# Altium schematic symbol library jlcpcb_2025_04_capacitors_extended_1206.schlib: 2503 symbols (part 13 of 14)
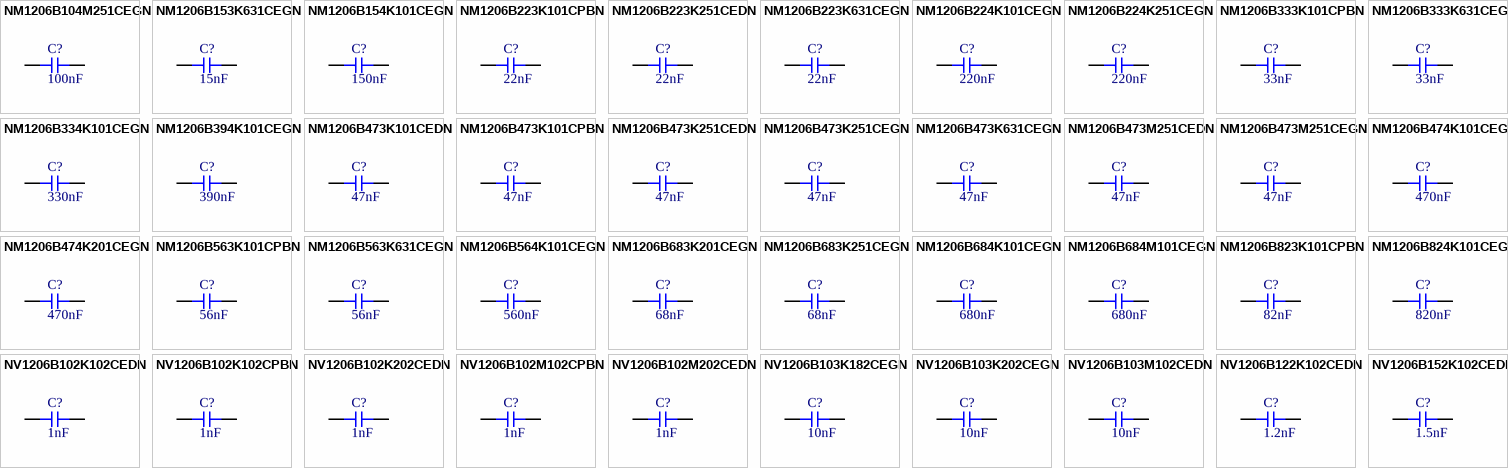
[diagram p74: symbols NM1206B104M251CEGN to NV1206B152K102CEDN]

## NV1206B103K202CEGN
designator C?  Capacitance: 10nF  (hidden comment: *)
Capacitor, Ceramic (MLCC), 10nF, ±10%, 2kV, ±10%, SMD 1206; Manufacturer: HUI JU; Manufacturer Part Number: NV1206B103K202CEGN; Package Size: 1206; JLCPCB Basic Part: No; JLCPCB Part Number: C976252; Supplier 1: LCSC; Category: Capacitors - MLCC; Supplier Part Number 1: C976252; Tolerance: ±10%; Voltage Rating: 2kV; RoHS: Yes; ComponentLink1Description: Datasheet; ComponentLink1URL: https://wmsc.lcsc.com/wmsc/upload/file/pdf/v2/lcsc/2201131430_HUI-JU-NV1206B103K202CEGN_C976252.pdf; ComponentLink2Description: JLCPCB Part URL; ComponentLink2URL: https://jlcpcb.com/partdetail/C976252; ComponentLink3Description: LCSC Part URL; ComponentLink3URL: https://lcsc.com/product-detail/Multilayer-Ceramic-Capacitors-MLCC---SMD-SMT_HUI-JU-HUI-JU-NV1206B103K202CEGN_C976252.html
footprint CAP-1206 (1206 (3216M) Capacitor)
pins: 1, 2

## NV1206B103M102CEDN
designator C?  Capacitance: 10nF  (hidden comment: *)
Capacitor, Ceramic (MLCC), 10nF, ±20%, 1kV, X7R, ±20%, SMD 1206; Manufacturer: HUI JU; Manufacturer Part Number: NV1206B103M102CEDN; Package Size: 1206; JLCPCB Basic Part: No; JLCPCB Part Number: C840120; Supplier 1: LCSC; Category: Capacitors - MLCC; Supplier Part Number 1: C840120; Tolerance: ±20%; Voltage Rating: 1kV; Temperature Coefficient: X7R; RoHS: Yes; ComponentLink1Description: Datasheet; ComponentLink1URL: https://wmsc.lcsc.com/wmsc/upload/file/pdf/v2/lcsc/2304140030_HUI-JU-NV1206B103M102CEDN_C840120.pdf; ComponentLink2Description: JLCPCB Part URL; ComponentLink2URL: https://jlcpcb.com/partdetail/C840120; ComponentLink3Description: LCSC Part URL; ComponentLink3URL: https://lcsc.com/product-detail/Multilayer-Ceramic-Capacitors-MLCC---SMD-SMT_HUI-JU-HUI-JU-NV1206B103M102CEDN_C840120.html
footprint CAP-1206 (1206 (3216M) Capacitor)
pins: 1, 2

## NV1206B122K102CEDN
designator C?  Capacitance: 1.2nF  (hidden comment: *)
Capacitor, Ceramic (MLCC), 1.2nF, ±10%, 1kV, ±10%, SMD 1206; Manufacturer: HUI JU; Manufacturer Part Number: NV1206B122K102CEDN; Package Size: 1206; JLCPCB Basic Part: No; JLCPCB Part Number: C2835170; Supplier 1: LCSC; Category: Capacitors - MLCC; Supplier Part Number 1: C2835170; Tolerance: ±10%; Voltage Rating: 1kV; RoHS: Yes; ComponentLink1Description: Datasheet; ComponentLink1URL: https://wmsc.lcsc.com/wmsc/upload/file/pdf/v2/lcsc/2304140030_HUI-JU-NV1206B122K102CEDN_C2835170.pdf; ComponentLink2Description: JLCPCB Part URL; ComponentLink2URL: https://jlcpcb.com/partdetail/C2835170; ComponentLink3Description: LCSC Part URL; ComponentLink3URL: https://lcsc.com/product-detail/Multilayer-Ceramic-Capacitors-MLCC---SMD-SMT_HUI-JU-HUI-JU-NV1206B122K102CEDN_C2835170.html
footprint CAP-1206 (1206 (3216M) Capacitor)
pins: 1, 2

## NV1206B152K102CEDN
designator C?  Capacitance: 1.5nF  (hidden comment: *)
Capacitor, Ceramic (MLCC), 1.5nF, ±10%, 1kV, X7R, ±10%, SMD 1206; Manufacturer: HUI JU; Manufacturer Part Number: NV1206B152K102CEDN; Package Size: 1206; JLCPCB Basic Part: No; JLCPCB Part Number: C710471; Supplier 1: LCSC; Category: Capacitors - MLCC; Supplier Part Number 1: C710471; Tolerance: ±10%; Voltage Rating: 1kV; Temperature Coefficient: X7R; RoHS: Yes; ComponentLink1Description: Datasheet; ComponentLink1URL: https://wmsc.lcsc.com/wmsc/upload/file/pdf/v2/lcsc/2304140030_HUI-JU-NV1206B152K102CEDN_C710471.pdf; ComponentLink2Description: JLCPCB Part URL; ComponentLink2URL: https://jlcpcb.com/partdetail/C710471; ComponentLink3Description: LCSC Part URL; ComponentLink3URL: https://lcsc.com/product-detail/Multilayer-Ceramic-Capacitors-MLCC---SMD-SMT_HUI-JU-HUI-JU-NV1206B152K102CEDN_C710471.html
footprint CAP-1206 (1206 (3216M) Capacitor)
pins: 1, 2

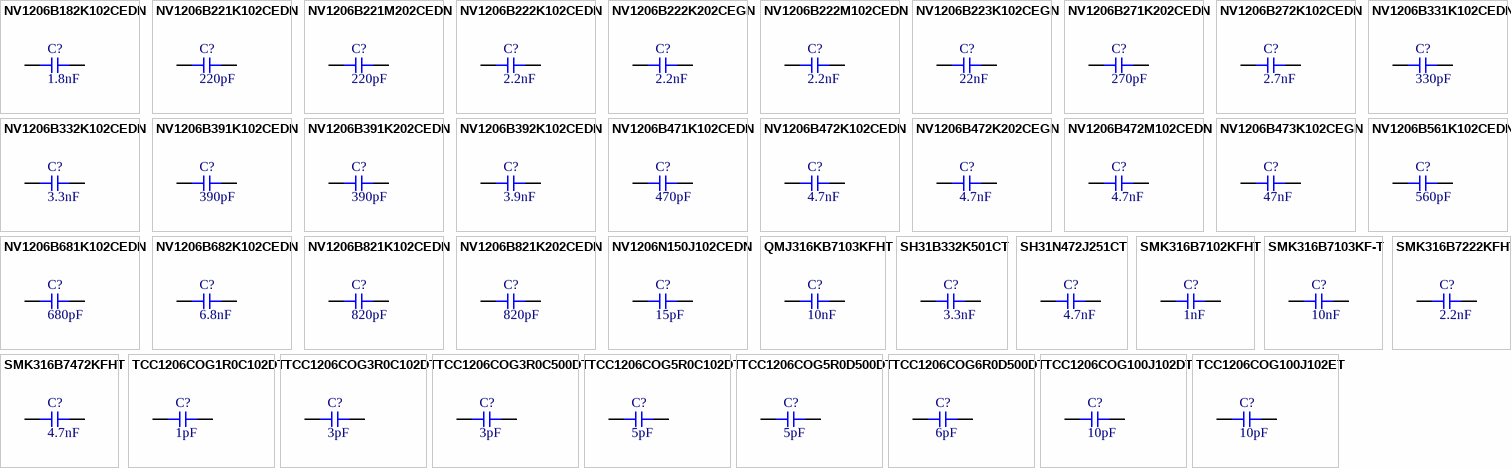
[diagram p55: symbols NV1206B182K102CEDN to TCC1206COG100J102ET]

## NV1206B182K102CEDN
designator C?  Capacitance: 1.8nF  (hidden comment: *)
Capacitor, Ceramic (MLCC), 1.8nF, 1kV, SMD 1206; Manufacturer: HUI JU; Manufacturer Part Number: NV1206B182K102CEDN; Package Size: 1206; JLCPCB Basic Part: No; JLCPCB Part Number: C2760344; Supplier 1: LCSC; Category: Capacitors - MLCC; Supplier Part Number 1: C2760344; Voltage Rating: 1kV; RoHS: Yes; ComponentLink1Description: Datasheet; ComponentLink1URL: https://wmsc.lcsc.com/wmsc/upload/file/pdf/v2/lcsc/2304140030_HUI-JU-NV1206B182K102CEDN_C2760344.pdf; ComponentLink2Description: JLCPCB Part URL; ComponentLink2URL: https://jlcpcb.com/partdetail/C2760344; ComponentLink3Description: LCSC Part URL; ComponentLink3URL: https://lcsc.com/product-detail/Multilayer-Ceramic-Capacitors-MLCC---SMD-SMT_HUI-JU-HUI-JU-NV1206B182K102CEDN_C2760344.html
footprint CAP-1206 (1206 (3216M) Capacitor)
pins: 1, 2

## NV1206B221K102CEDN
designator C?  Capacitance: 220pF  (hidden comment: *)
Capacitor, Ceramic (MLCC), 220pF, ±10%, 1kV, X7R, ±10%, SMD 1206; Manufacturer: HUI JU; Manufacturer Part Number: NV1206B221K102CEDN; Package Size: 1206; JLCPCB Basic Part: No; JLCPCB Part Number: C710472; Supplier 1: LCSC; Category: Capacitors - MLCC; Supplier Part Number 1: C710472; Tolerance: ±10%; Voltage Rating: 1kV; Temperature Coefficient: X7R; RoHS: Yes; ComponentLink1Description: Datasheet; ComponentLink1URL: https://wmsc.lcsc.com/wmsc/upload/file/pdf/v2/lcsc/2304140030_HUI-JU-NV1206B221K102CEDN_C710472.pdf; ComponentLink2Description: JLCPCB Part URL; ComponentLink2URL: https://jlcpcb.com/partdetail/C710472; ComponentLink3Description: LCSC Part URL; ComponentLink3URL: https://lcsc.com/product-detail/Multilayer-Ceramic-Capacitors-MLCC---SMD-SMT_HUI-JU-HUI-JU-NV1206B221K102CEDN_C710472.html
footprint CAP-1206 (1206 (3216M) Capacitor)
pins: 1, 2

## NV1206B221M202CEDN
designator C?  Capacitance: 220pF  (hidden comment: *)
Capacitor, Ceramic (MLCC), 220pF, 2kV, SMD 1206; Manufacturer: HUI JU; Manufacturer Part Number: NV1206B221M202CEDN; Package Size: 1206; JLCPCB Basic Part: No; JLCPCB Part Number: C2760355; Supplier 1: LCSC; Category: Capacitors - MLCC; Supplier Part Number 1: C2760355; Voltage Rating: 2kV; RoHS: Yes; ComponentLink1Description: Datasheet; ComponentLink1URL: https://wmsc.lcsc.com/wmsc/upload/file/pdf/v2/lcsc/2304140030_HUI-JU-NV1206B221M202CEDN_C2760355.pdf; ComponentLink2Description: JLCPCB Part URL; ComponentLink2URL: https://jlcpcb.com/partdetail/C2760355; ComponentLink3Description: LCSC Part URL; ComponentLink3URL: https://lcsc.com/product-detail/Multilayer-Ceramic-Capacitors-MLCC---SMD-SMT_HUI-JU-HUI-JU-NV1206B221M202CEDN_C2760355.html
footprint CAP-1206 (1206 (3216M) Capacitor)
pins: 1, 2

## NV1206B222K102CEDN
designator C?  Capacitance: 2.2nF  (hidden comment: *)
Capacitor, Ceramic (MLCC), 2.2nF, ±10%, 1kV, X7R, ±10%, SMD 1206; Manufacturer: HUI JU; Manufacturer Part Number: NV1206B222K102CEDN; Package Size: 1206; JLCPCB Basic Part: No; JLCPCB Part Number: C710473; Supplier 1: LCSC; Category: Capacitors - MLCC; Supplier Part Number 1: C710473; Tolerance: ±10%; Voltage Rating: 1kV; Temperature Coefficient: X7R; RoHS: Yes; ComponentLink1Description: Datasheet; ComponentLink1URL: https://wmsc.lcsc.com/wmsc/upload/file/pdf/v2/lcsc/2304140030_HUI-JU-NV1206B222K102CEDN_C710473.pdf; ComponentLink2Description: JLCPCB Part URL; ComponentLink2URL: https://jlcpcb.com/partdetail/C710473; ComponentLink3Description: LCSC Part URL; ComponentLink3URL: https://lcsc.com/product-detail/Multilayer-Ceramic-Capacitors-MLCC---SMD-SMT_HUI-JU-HUI-JU-NV1206B222K102CEDN_C710473.html
footprint CAP-1206 (1206 (3216M) Capacitor)
pins: 1, 2

## NV1206B222K202CEGN
designator C?  Capacitance: 2.2nF  (hidden comment: *)
Capacitor, Ceramic (MLCC), 2.2nF, ±10%, 2kV, X7R, ±10%, SMD 1206; Manufacturer: HUI JU; Manufacturer Part Number: NV1206B222K202CEGN; Package Size: 1206; JLCPCB Basic Part: No; JLCPCB Part Number: C720963; Supplier 1: LCSC; Category: Capacitors - MLCC; Supplier Part Number 1: C720963; Tolerance: ±10%; Voltage Rating: 2kV; Temperature Coefficient: X7R; RoHS: Yes; ComponentLink1Description: Datasheet; ComponentLink1URL: https://wmsc.lcsc.com/wmsc/upload/file/pdf/v2/lcsc/2304140030_HUI-JU-NV1206B222K202CEGN_C720963.pdf; ComponentLink2Description: JLCPCB Part URL; ComponentLink2URL: https://jlcpcb.com/partdetail/C720963; ComponentLink3Description: LCSC Part URL; ComponentLink3URL: https://lcsc.com/product-detail/Multilayer-Ceramic-Capacitors-MLCC---SMD-SMT_HUI-JU-HUI-JU-NV1206B222K202CEGN_C720963.html
footprint CAP-1206 (1206 (3216M) Capacitor)
pins: 1, 2

## NV1206B222M102CEDN
designator C?  Capacitance: 2.2nF  (hidden comment: *)
Capacitor, Ceramic (MLCC), 2.2nF, ±20%, 1kV, ±20%, SMD 1206; Manufacturer: HUI JU; Manufacturer Part Number: NV1206B222M102CEDN; Package Size: 1206; JLCPCB Basic Part: No; JLCPCB Part Number: C841556; Supplier 1: LCSC; Category: Capacitors - MLCC; Supplier Part Number 1: C841556; Tolerance: ±20%; Voltage Rating: 1kV; RoHS: Yes; ComponentLink1Description: Datasheet; ComponentLink1URL: https://wmsc.lcsc.com/wmsc/upload/file/pdf/v2/lcsc/2304140030_HUI-JU-NV1206B222M102CEDN_C841556.pdf; ComponentLink2Description: JLCPCB Part URL; ComponentLink2URL: https://jlcpcb.com/partdetail/C841556; ComponentLink3Description: LCSC Part URL; ComponentLink3URL: https://lcsc.com/product-detail/Multilayer-Ceramic-Capacitors-MLCC---SMD-SMT_HUI-JU-HUI-JU-NV1206B222M102CEDN_C841556.html
footprint CAP-1206 (1206 (3216M) Capacitor)
pins: 1, 2

## NV1206B223K102CEGN
designator C?  Capacitance: 22nF  (hidden comment: *)
Capacitor, Ceramic (MLCC), 22nF, ±10%, 1kV, ±10%, SMD 1206; Manufacturer: HUI JU; Manufacturer Part Number: NV1206B223K102CEGN; Package Size: 1206; JLCPCB Basic Part: No; JLCPCB Part Number: C780704; Supplier 1: LCSC; Category: Capacitors - MLCC; Supplier Part Number 1: C780704; Tolerance: ±10%; Voltage Rating: 1kV; RoHS: Yes; ComponentLink1Description: Datasheet; ComponentLink1URL: https://wmsc.lcsc.com/wmsc/upload/file/pdf/v2/lcsc/2304140030_HUI-JU-NV1206B223K102CEGN_C780704.pdf; ComponentLink2Description: JLCPCB Part URL; ComponentLink2URL: https://jlcpcb.com/partdetail/C780704; ComponentLink3Description: LCSC Part URL; ComponentLink3URL: https://lcsc.com/product-detail/Multilayer-Ceramic-Capacitors-MLCC---SMD-SMT_HUI-JU-HUI-JU-NV1206B223K102CEGN_C780704.html
footprint CAP-1206 (1206 (3216M) Capacitor)
pins: 1, 2

## NV1206B271K202CEDN
designator C?  Capacitance: 270pF  (hidden comment: *)
Capacitor, Ceramic (MLCC), 270pF, ±10%, 2kV, ±10%, SMD 1206; Manufacturer: HUI JU; Manufacturer Part Number: NV1206B271K202CEDN; Package Size: 1206; JLCPCB Basic Part: No; JLCPCB Part Number: C841557; Supplier 1: LCSC; Category: Capacitors - MLCC; Supplier Part Number 1: C841557; Tolerance: ±10%; Voltage Rating: 2kV; RoHS: Yes; ComponentLink1Description: Datasheet; ComponentLink1URL: https://wmsc.lcsc.com/wmsc/upload/file/pdf/v2/lcsc/2304140030_HUI-JU-NV1206B271K202CEDN_C841557.pdf; ComponentLink2Description: JLCPCB Part URL; ComponentLink2URL: https://jlcpcb.com/partdetail/C841557; ComponentLink3Description: LCSC Part URL; ComponentLink3URL: https://lcsc.com/product-detail/Multilayer-Ceramic-Capacitors-MLCC---SMD-SMT_HUI-JU-HUI-JU-NV1206B271K202CEDN_C841557.html
footprint CAP-1206 (1206 (3216M) Capacitor)
pins: 1, 2

## NV1206B272K102CEDN
designator C?  Capacitance: 2.7nF  (hidden comment: *)
Capacitor, Ceramic (MLCC), 2.7nF, ±10%, 1kV, ±10%, SMD 1206; Manufacturer: HUI JU; Manufacturer Part Number: NV1206B272K102CEDN; Package Size: 1206; JLCPCB Basic Part: No; JLCPCB Part Number: C841558; Supplier 1: LCSC; Category: Capacitors - MLCC; Supplier Part Number 1: C841558; Tolerance: ±10%; Voltage Rating: 1kV; RoHS: Yes; ComponentLink1Description: Datasheet; ComponentLink1URL: https://wmsc.lcsc.com/wmsc/upload/file/pdf/v2/lcsc/2304140030_HUI-JU-NV1206B272K102CEDN_C841558.pdf; ComponentLink2Description: JLCPCB Part URL; ComponentLink2URL: https://jlcpcb.com/partdetail/C841558; ComponentLink3Description: LCSC Part URL; ComponentLink3URL: https://lcsc.com/product-detail/Multilayer-Ceramic-Capacitors-MLCC---SMD-SMT_HUI-JU-HUI-JU-NV1206B272K102CEDN_C841558.html
footprint CAP-1206 (1206 (3216M) Capacitor)
pins: 1, 2

## NV1206B331K102CEDN
designator C?  Capacitance: 330pF  (hidden comment: *)
Capacitor, Ceramic (MLCC), 330pF, ±10%, 1kV, X7R, ±10%, SMD 1206; Manufacturer: HUI JU; Manufacturer Part Number: NV1206B331K102CEDN; Package Size: 1206; JLCPCB Basic Part: No; JLCPCB Part Number: C725800; Supplier 1: LCSC; Category: Capacitors - MLCC; Supplier Part Number 1: C725800; Tolerance: ±10%; Voltage Rating: 1kV; Temperature Coefficient: X7R; RoHS: Yes; ComponentLink1Description: Datasheet; ComponentLink1URL: https://wmsc.lcsc.com/wmsc/upload/file/pdf/v2/lcsc/2304140030_HUI-JU-NV1206B331K102CEDN_C725800.pdf; ComponentLink2Description: JLCPCB Part URL; ComponentLink2URL: https://jlcpcb.com/partdetail/C725800; ComponentLink3Description: LCSC Part URL; ComponentLink3URL: https://lcsc.com/product-detail/Multilayer-Ceramic-Capacitors-MLCC---SMD-SMT_HUI-JU-HUI-JU-NV1206B331K102CEDN_C725800.html
footprint CAP-1206 (1206 (3216M) Capacitor)
pins: 1, 2

## NV1206B332K102CEDN
designator C?  Capacitance: 3.3nF  (hidden comment: *)
Capacitor, Ceramic (MLCC), 3.3nF, ±10%, 1kV, X7R, ±10%, SMD 1206; Manufacturer: HUI JU; Manufacturer Part Number: NV1206B332K102CEDN; Package Size: 1206; JLCPCB Basic Part: No; JLCPCB Part Number: C710476; Supplier 1: LCSC; Category: Capacitors - MLCC; Supplier Part Number 1: C710476; Tolerance: ±10%; Voltage Rating: 1kV; Temperature Coefficient: X7R; RoHS: Yes; ComponentLink1Description: Datasheet; ComponentLink1URL: https://wmsc.lcsc.com/wmsc/upload/file/pdf/v2/lcsc/2304140030_HUI-JU-NV1206B332K102CEDN_C710476.pdf; ComponentLink2Description: JLCPCB Part URL; ComponentLink2URL: https://jlcpcb.com/partdetail/C710476; ComponentLink3Description: LCSC Part URL; ComponentLink3URL: https://lcsc.com/product-detail/Multilayer-Ceramic-Capacitors-MLCC---SMD-SMT_HUI-JU-HUI-JU-NV1206B332K102CEDN_C710476.html
footprint CAP-1206 (1206 (3216M) Capacitor)
pins: 1, 2

## NV1206B391K102CEDN
designator C?  Capacitance: 390pF  (hidden comment: *)
Capacitor, Ceramic (MLCC), 390pF, ±10%, 1kV, ±10%, SMD 1206; Manufacturer: HUI JU; Manufacturer Part Number: NV1206B391K102CEDN; Package Size: 1206; JLCPCB Basic Part: No; JLCPCB Part Number: C2760364; Supplier 1: LCSC; Category: Capacitors - MLCC; Supplier Part Number 1: C2760364; Tolerance: ±10%; Voltage Rating: 1kV; RoHS: Yes; ComponentLink1Description: Datasheet; ComponentLink1URL: https://wmsc.lcsc.com/wmsc/upload/file/pdf/v2/lcsc/2103161035_HUI-JU-NV1206B391K102CEDN_C2760364.pdf; ComponentLink2Description: JLCPCB Part URL; ComponentLink2URL: https://jlcpcb.com/partdetail/C2760364; ComponentLink3Description: LCSC Part URL; ComponentLink3URL: https://lcsc.com/product-detail/Multilayer-Ceramic-Capacitors-MLCC---SMD-SMT_HUI-JU-HUI-JU-NV1206B391K102CEDN_C2760364.html
footprint CAP-1206 (1206 (3216M) Capacitor)
pins: 1, 2

## NV1206B391K202CEDN
designator C?  Capacitance: 390pF  (hidden comment: *)
Capacitor, Ceramic (MLCC), 390pF, ±10%, 2kV, X7R, ±10%, SMD 1206; Manufacturer: HUI JU; Manufacturer Part Number: NV1206B391K202CEDN; Package Size: 1206; JLCPCB Basic Part: No; JLCPCB Part Number: C840124; Supplier 1: LCSC; Category: Capacitors - MLCC; Supplier Part Number 1: C840124; Tolerance: ±10%; Voltage Rating: 2kV; Temperature Coefficient: X7R; RoHS: Yes; ComponentLink1Description: Datasheet; ComponentLink1URL: https://wmsc.lcsc.com/wmsc/upload/file/pdf/v2/lcsc/2304140030_HUI-JU-NV1206B391K202CEDN_C840124.pdf; ComponentLink2Description: JLCPCB Part URL; ComponentLink2URL: https://jlcpcb.com/partdetail/C840124; ComponentLink3Description: LCSC Part URL; ComponentLink3URL: https://lcsc.com/product-detail/Multilayer-Ceramic-Capacitors-MLCC---SMD-SMT_HUI-JU-HUI-JU-NV1206B391K202CEDN_C840124.html
footprint CAP-1206 (1206 (3216M) Capacitor)
pins: 1, 2

## NV1206B392K102CEDN
designator C?  Capacitance: 3.9nF  (hidden comment: *)
Capacitor, Ceramic (MLCC), 3.9nF, ±10%, 1kV, ±10%, SMD 1206; Manufacturer: HUI JU; Manufacturer Part Number: NV1206B392K102CEDN; Package Size: 1206; JLCPCB Basic Part: No; JLCPCB Part Number: C841562; Supplier 1: LCSC; Category: Capacitors - MLCC; Supplier Part Number 1: C841562; Tolerance: ±10%; Voltage Rating: 1kV; RoHS: Yes; ComponentLink1Description: Datasheet; ComponentLink1URL: https://wmsc.lcsc.com/wmsc/upload/file/pdf/v2/lcsc/2304140030_HUI-JU-NV1206B392K102CEDN_C841562.pdf; ComponentLink2Description: JLCPCB Part URL; ComponentLink2URL: https://jlcpcb.com/partdetail/C841562; ComponentLink3Description: LCSC Part URL; ComponentLink3URL: https://lcsc.com/product-detail/Multilayer-Ceramic-Capacitors-MLCC---SMD-SMT_HUI-JU-HUI-JU-NV1206B392K102CEDN_C841562.html
footprint CAP-1206 (1206 (3216M) Capacitor)
pins: 1, 2

## NV1206B471K102CEDN
designator C?  Capacitance: 470pF  (hidden comment: *)
Capacitor, Ceramic (MLCC), 470pF, ±10%, 1kV, X7R, ±10%, SMD 1206; Manufacturer: HUI JU; Manufacturer Part Number: NV1206B471K102CEDN; Package Size: 1206; JLCPCB Basic Part: No; JLCPCB Part Number: C717018; Supplier 1: LCSC; Category: Capacitors - MLCC; Supplier Part Number 1: C717018; Tolerance: ±10%; Voltage Rating: 1kV; Temperature Coefficient: X7R; RoHS: Yes; ComponentLink1Description: Datasheet; ComponentLink1URL: https://wmsc.lcsc.com/wmsc/upload/file/pdf/v2/lcsc/2304140030_HUI-JU-NV1206B471K102CEDN_C717018.pdf; ComponentLink2Description: JLCPCB Part URL; ComponentLink2URL: https://jlcpcb.com/partdetail/C717018; ComponentLink3Description: LCSC Part URL; ComponentLink3URL: https://lcsc.com/product-detail/Multilayer-Ceramic-Capacitors-MLCC---SMD-SMT_HUI-JU-HUI-JU-NV1206B471K102CEDN_C717018.html
footprint CAP-1206 (1206 (3216M) Capacitor)
pins: 1, 2

## NV1206B472K102CEDN
designator C?  Capacitance: 4.7nF  (hidden comment: *)
Capacitor, Ceramic (MLCC), 4.7nF, ±10%, 1kV, X7R, ±10%, SMD 1206; Manufacturer: HUI JU; Manufacturer Part Number: NV1206B472K102CEDN; Package Size: 1206; JLCPCB Basic Part: No; JLCPCB Part Number: C717016; Supplier 1: LCSC; Category: Capacitors - MLCC; Supplier Part Number 1: C717016; Tolerance: ±10%; Voltage Rating: 1kV; Temperature Coefficient: X7R; RoHS: Yes; ComponentLink1Description: Datasheet; ComponentLink1URL: https://wmsc.lcsc.com/wmsc/upload/file/pdf/v2/lcsc/2304140030_HUI-JU-NV1206B472K102CEDN_C717016.pdf; ComponentLink2Description: JLCPCB Part URL; ComponentLink2URL: https://jlcpcb.com/partdetail/C717016; ComponentLink3Description: LCSC Part URL; ComponentLink3URL: https://lcsc.com/product-detail/Multilayer-Ceramic-Capacitors-MLCC---SMD-SMT_HUI-JU-HUI-JU-NV1206B472K102CEDN_C717016.html
footprint CAP-1206 (1206 (3216M) Capacitor)
pins: 1, 2

## NV1206B472K202CEGN
designator C?  Capacitance: 4.7nF  (hidden comment: *)
Capacitor, Ceramic (MLCC), 4.7nF, ±10%, 2kV, X7R, ±10%, SMD 1206; Manufacturer: HUI JU; Manufacturer Part Number: NV1206B472K202CEGN; Package Size: 1206; JLCPCB Basic Part: No; JLCPCB Part Number: C784438; Supplier 1: LCSC; Category: Capacitors - MLCC; Supplier Part Number 1: C784438; Tolerance: ±10%; Voltage Rating: 2kV; Temperature Coefficient: X7R; RoHS: Yes; ComponentLink1Description: Datasheet; ComponentLink1URL: https://wmsc.lcsc.com/wmsc/upload/file/pdf/v2/lcsc/2304140030_HUI-JU-NV1206B472K202CEGN_C784438.pdf; ComponentLink2Description: JLCPCB Part URL; ComponentLink2URL: https://jlcpcb.com/partdetail/C784438; ComponentLink3Description: LCSC Part URL; ComponentLink3URL: https://lcsc.com/product-detail/Multilayer-Ceramic-Capacitors-MLCC---SMD-SMT_HUI-JU-HUI-JU-NV1206B472K202CEGN_C784438.html
footprint CAP-1206 (1206 (3216M) Capacitor)
pins: 1, 2

## NV1206B472M102CEDN
designator C?  Capacitance: 4.7nF  (hidden comment: *)
Capacitor, Ceramic (MLCC), 4.7nF, ±20%, 1kV, X7R, ±20%, SMD 1206; Manufacturer: HUI JU; Manufacturer Part Number: NV1206B472M102CEDN; Package Size: 1206; JLCPCB Basic Part: No; JLCPCB Part Number: C840126; Supplier 1: LCSC; Category: Capacitors - MLCC; Supplier Part Number 1: C840126; Tolerance: ±20%; Voltage Rating: 1kV; Temperature Coefficient: X7R; RoHS: Yes; ComponentLink1Description: Datasheet; ComponentLink1URL: https://wmsc.lcsc.com/wmsc/upload/file/pdf/v2/lcsc/2304140030_HUI-JU-NV1206B472M102CEDN_C840126.pdf; ComponentLink2Description: JLCPCB Part URL; ComponentLink2URL: https://jlcpcb.com/partdetail/C840126; ComponentLink3Description: LCSC Part URL; ComponentLink3URL: https://lcsc.com/product-detail/Multilayer-Ceramic-Capacitors-MLCC---SMD-SMT_HUI-JU-HUI-JU-NV1206B472M102CEDN_C840126.html
footprint CAP-1206 (1206 (3216M) Capacitor)
pins: 1, 2

## NV1206B473K102CEGN
designator C?  Capacitance: 47nF  (hidden comment: *)
Capacitor, Ceramic (MLCC), 47nF, ±10%, 1kV, X7R, ±10%, SMD 1206; Manufacturer: HUI JU; Manufacturer Part Number: NV1206B473K102CEGN; Package Size: 1206; JLCPCB Basic Part: No; JLCPCB Part Number: C840127; Supplier 1: LCSC; Category: Capacitors - MLCC; Supplier Part Number 1: C840127; Tolerance: ±10%; Voltage Rating: 1kV; Temperature Coefficient: X7R; RoHS: Yes; ComponentLink1Description: Datasheet; ComponentLink1URL: https://wmsc.lcsc.com/wmsc/upload/file/pdf/v2/lcsc/2304140030_HUI-JU-NV1206B473K102CEGN_C840127.pdf; ComponentLink2Description: JLCPCB Part URL; ComponentLink2URL: https://jlcpcb.com/partdetail/C840127; ComponentLink3Description: LCSC Part URL; ComponentLink3URL: https://lcsc.com/product-detail/Multilayer-Ceramic-Capacitors-MLCC---SMD-SMT_HUI-JU-HUI-JU-NV1206B473K102CEGN_C840127.html
footprint CAP-1206 (1206 (3216M) Capacitor)
pins: 1, 2

## NV1206B561K102CEDN
designator C?  Capacitance: 560pF  (hidden comment: *)
Capacitor, Ceramic (MLCC), 560pF, ±10%, 1kV, X7R, ±10%, SMD 1206; Manufacturer: HUI JU; Manufacturer Part Number: NV1206B561K102CEDN; Package Size: 1206; JLCPCB Basic Part: No; JLCPCB Part Number: C784439; Supplier 1: LCSC; Category: Capacitors - MLCC; Supplier Part Number 1: C784439; Tolerance: ±10%; Voltage Rating: 1kV; Temperature Coefficient: X7R; RoHS: Yes; ComponentLink1Description: Datasheet; ComponentLink1URL: https://wmsc.lcsc.com/wmsc/upload/file/pdf/v2/lcsc/2304140030_HUI-JU-NV1206B561K102CEDN_C784439.pdf; ComponentLink2Description: JLCPCB Part URL; ComponentLink2URL: https://jlcpcb.com/partdetail/C784439; ComponentLink3Description: LCSC Part URL; ComponentLink3URL: https://lcsc.com/product-detail/Multilayer-Ceramic-Capacitors-MLCC---SMD-SMT_HUI-JU-HUI-JU-NV1206B561K102CEDN_C784439.html
footprint CAP-1206 (1206 (3216M) Capacitor)
pins: 1, 2

## NV1206B681K102CEDN
designator C?  Capacitance: 680pF  (hidden comment: *)
Capacitor, Ceramic (MLCC), 680pF, ±10%, 1kV, X7R, ±10%, SMD 1206; Manufacturer: HUI JU; Manufacturer Part Number: NV1206B681K102CEDN; Package Size: 1206; JLCPCB Basic Part: No; JLCPCB Part Number: C784440; Supplier 1: LCSC; Category: Capacitors - MLCC; Supplier Part Number 1: C784440; Tolerance: ±10%; Voltage Rating: 1kV; Temperature Coefficient: X7R; RoHS: Yes; ComponentLink1Description: Datasheet; ComponentLink1URL: https://wmsc.lcsc.com/wmsc/upload/file/pdf/v2/lcsc/2304140030_HUI-JU-NV1206B681K102CEDN_C784440.pdf; ComponentLink2Description: JLCPCB Part URL; ComponentLink2URL: https://jlcpcb.com/partdetail/C784440; ComponentLink3Description: LCSC Part URL; ComponentLink3URL: https://lcsc.com/product-detail/Multilayer-Ceramic-Capacitors-MLCC---SMD-SMT_HUI-JU-HUI-JU-NV1206B681K102CEDN_C784440.html
footprint CAP-1206 (1206 (3216M) Capacitor)
pins: 1, 2

## NV1206B682K102CEDN
designator C?  Capacitance: 6.8nF  (hidden comment: *)
Capacitor, Ceramic (MLCC), 6.8nF, ±10%, 1kV, ±10%, SMD 1206; Manufacturer: HUI JU; Manufacturer Part Number: NV1206B682K102CEDN; Package Size: 1206; JLCPCB Basic Part: No; JLCPCB Part Number: C841565; Supplier 1: LCSC; Category: Capacitors - MLCC; Supplier Part Number 1: C841565; Tolerance: ±10%; Voltage Rating: 1kV; RoHS: Yes; ComponentLink1Description: Datasheet; ComponentLink1URL: https://wmsc.lcsc.com/wmsc/upload/file/pdf/v2/lcsc/2304140030_HUI-JU-NV1206B682K102CEDN_C841565.pdf; ComponentLink2Description: JLCPCB Part URL; ComponentLink2URL: https://jlcpcb.com/partdetail/C841565; ComponentLink3Description: LCSC Part URL; ComponentLink3URL: https://lcsc.com/product-detail/Multilayer-Ceramic-Capacitors-MLCC---SMD-SMT_HUI-JU-HUI-JU-NV1206B682K102CEDN_C841565.html
footprint CAP-1206 (1206 (3216M) Capacitor)
pins: 1, 2

## NV1206B821K102CEDN
designator C?  Capacitance: 820pF  (hidden comment: *)
Capacitor, Ceramic (MLCC), 820pF, ±10%, 1kV, ±10%, SMD 1206; Manufacturer: HUI JU; Manufacturer Part Number: NV1206B821K102CEDN; Package Size: 1206; JLCPCB Basic Part: No; JLCPCB Part Number: C841567; Supplier 1: LCSC; Category: Capacitors - MLCC; Supplier Part Number 1: C841567; Tolerance: ±10%; Voltage Rating: 1kV; RoHS: Yes; ComponentLink1Description: Datasheet; ComponentLink1URL: https://wmsc.lcsc.com/wmsc/upload/file/pdf/v2/lcsc/2304140030_HUI-JU-NV1206B821K102CEDN_C841567.pdf; ComponentLink2Description: JLCPCB Part URL; ComponentLink2URL: https://jlcpcb.com/partdetail/C841567; ComponentLink3Description: LCSC Part URL; ComponentLink3URL: https://lcsc.com/product-detail/Multilayer-Ceramic-Capacitors-MLCC---SMD-SMT_HUI-JU-HUI-JU-NV1206B821K102CEDN_C841567.html
footprint CAP-1206 (1206 (3216M) Capacitor)
pins: 1, 2

## NV1206B821K202CEDN
designator C?  Capacitance: 820pF  (hidden comment: *)
Capacitor, Ceramic (MLCC), 820pF, ±10%, 2kV, ±10%, SMD 1206; Manufacturer: HUI JU; Manufacturer Part Number: NV1206B821K202CEDN; Package Size: 1206; JLCPCB Basic Part: No; JLCPCB Part Number: C841568; Supplier 1: LCSC; Category: Capacitors - MLCC; Supplier Part Number 1: C841568; Tolerance: ±10%; Voltage Rating: 2kV; RoHS: Yes; ComponentLink1Description: Datasheet; ComponentLink1URL: https://wmsc.lcsc.com/wmsc/upload/file/pdf/v2/lcsc/2304140030_HUI-JU-NV1206B821K202CEDN_C841568.pdf; ComponentLink2Description: JLCPCB Part URL; ComponentLink2URL: https://jlcpcb.com/partdetail/C841568; ComponentLink3Description: LCSC Part URL; ComponentLink3URL: https://lcsc.com/product-detail/Multilayer-Ceramic-Capacitors-MLCC---SMD-SMT_HUI-JU-HUI-JU-NV1206B821K202CEDN_C841568.html
footprint CAP-1206 (1206 (3216M) Capacitor)
pins: 1, 2

## NV1206N150J102CEDN
designator C?  Capacitance: 15pF  (hidden comment: *)
Capacitor, Ceramic (MLCC), 15pF, ±5%, 1kV, C0G, ±5%, SMD 1206; Manufacturer: HUI JU; Manufacturer Part Number: NV1206N150J102CEDN; Package Size: 1206; JLCPCB Basic Part: No; JLCPCB Part Number: C2961032; Supplier 1: LCSC; Category: Capacitors - MLCC; Supplier Part Number 1: C2961032; Tolerance: ±5%; Voltage Rating: 1kV; Temperature Coefficient: C0G; RoHS: Yes; ComponentLink1Description: Datasheet; ComponentLink1URL: https://wmsc.lcsc.com/wmsc/upload/file/pdf/v2/lcsc/2201141700_HUI-JU-NV1206N150J102CEDN_C2961032.pdf; ComponentLink2Description: JLCPCB Part URL; ComponentLink2URL: https://jlcpcb.com/partdetail/C2961032; ComponentLink3Description: LCSC Part URL; ComponentLink3URL: https://lcsc.com/product-detail/Multilayer-Ceramic-Capacitors-MLCC---SMD-SMT_HUI-JU-HUI-JU-NV1206N150J102CEDN_C2961032.html
footprint CAP-1206 (1206 (3216M) Capacitor)
pins: 1, 2

## QMJ316KB7103KFHT
designator C?  Capacitance: 10nF  (hidden comment: *)
Capacitor, Ceramic (MLCC), 10nF, ±10%, 250V, X7R, ±10%, SMD 1206; Manufacturer: Taiyo Yuden; Manufacturer Part Number: QMJ316KB7103KFHT; Package Size: 1206; JLCPCB Basic Part: No; JLCPCB Part Number: C2175940; Supplier 1: LCSC; Category: Capacitors - MLCC; Supplier Part Number 1: C2175940; Tolerance: ±10%; Voltage Rating: 250V; Temperature Coefficient: X7R; RoHS: Yes; ComponentLink1Description: Datasheet; ComponentLink1URL: https://wmsc.lcsc.com/wmsc/upload/file/pdf/v2/lcsc/2211282000_Taiyo-Yuden-QMJ316KB7103KFHT_C2175940.pdf; ComponentLink2Description: JLCPCB Part URL; ComponentLink2URL: https://jlcpcb.com/partdetail/C2175940; ComponentLink3Description: LCSC Part URL; ComponentLink3URL: https://lcsc.com/product-detail/Multilayer-Ceramic-Capacitors-MLCC---SMD-SMT_Taiyo-Yuden-Taiyo-Yuden-QMJ316KB7103KFHT_C2175940.html
footprint CAP-1206 (1206 (3216M) Capacitor)
pins: 1, 2

## SH31B332K501CT
designator C?  Capacitance: 3.3nF  (hidden comment: *)
Capacitor, Ceramic (MLCC), 3.3nF, ±10%, 500V, X7R, ±10%, SMD 1206; Manufacturer: Walsin Tech Corp; Manufacturer Part Number: SH31B332K501CT; Package Size: 1206; JLCPCB Basic Part: No; JLCPCB Part Number: C305138; Supplier 1: LCSC; Category: Capacitors - MLCC; Supplier Part Number 1: C305138; Tolerance: ±10%; Voltage Rating: 500V; Temperature Coefficient: X7R; RoHS: Yes; ComponentLink1Description: Datasheet; ComponentLink1URL: https://wmsc.lcsc.com/wmsc/upload/file/pdf/v2/lcsc/1811021514_Walsin-Tech-Corp-SH31B332K501CT_C305138.pdf; ComponentLink2Description: JLCPCB Part URL; ComponentLink2URL: https://jlcpcb.com/partdetail/C305138; ComponentLink3Description: LCSC Part URL; ComponentLink3URL: https://lcsc.com/product-detail/Multilayer-Ceramic-Capacitors-MLCC---SMD-SMT_Walsin-Tech-Corp-Walsin-Tech-Corp-SH31B332K501CT_C305138.html
footprint CAP-1206 (1206 (3216M) Capacitor)
pins: 1, 2

## SH31N472J251CT
designator C?  Capacitance: 4.7nF  (hidden comment: *)
Capacitor, Ceramic (MLCC), 4.7nF, ±5%, 250V, C0G, ±5%, SMD 1206; Manufacturer: Walsin Tech Corp; Manufacturer Part Number: SH31N472J251CT; Package Size: 1206; JLCPCB Basic Part: No; JLCPCB Part Number: C3836286; Supplier 1: LCSC; Category: Capacitors - MLCC; Supplier Part Number 1: C3836286; Tolerance: ±5%; Voltage Rating: 250V; Temperature Coefficient: C0G; RoHS: Yes; ComponentLink1Description: Datasheet; ComponentLink1URL: https://wmsc.lcsc.com/wmsc/upload/file/pdf/v2/lcsc/2401181522_Walsin-Tech-Corp-SH31N472J251CT_C3836286.pdf; ComponentLink2Description: JLCPCB Part URL; ComponentLink2URL: https://jlcpcb.com/partdetail/C3836286; ComponentLink3Description: LCSC Part URL; ComponentLink3URL: https://lcsc.com/product-detail/Multilayer-Ceramic-Capacitors-MLCC---SMD-SMT_Walsin-Tech-Corp-Walsin-Tech-Corp-SH31N472J251CT_C3836286.html
footprint CAP-1206 (1206 (3216M) Capacitor)
pins: 1, 2

## SMK316B7102KFHT
designator C?  Capacitance: 1nF  (hidden comment: *)
Capacitor, Ceramic (MLCC), 1nF, ±10%, 630V, X7R, ±10%, SMD 1206; Manufacturer: Taiyo Yuden; Manufacturer Part Number: SMK316B7102KFHT; Package Size: 1206; JLCPCB Basic Part: No; JLCPCB Part Number: C651029; Supplier 1: LCSC; Category: Capacitors - MLCC; Supplier Part Number 1: C651029; Tolerance: ±10%; Voltage Rating: 630V; Temperature Coefficient: X7R; RoHS: Yes; ComponentLink1Description: Datasheet; ComponentLink1URL: https://wmsc.lcsc.com/wmsc/upload/file/pdf/v2/lcsc/2304140030_Taiyo-Yuden-SMK316B7102KFHT_C651029.pdf; ComponentLink2Description: JLCPCB Part URL; ComponentLink2URL: https://jlcpcb.com/partdetail/C651029; ComponentLink3Description: LCSC Part URL; ComponentLink3URL: https://lcsc.com/product-detail/Multilayer-Ceramic-Capacitors-MLCC---SMD-SMT_Taiyo-Yuden-Taiyo-Yuden-SMK316B7102KFHT_C651029.html
footprint CAP-1206 (1206 (3216M) Capacitor)
pins: 1, 2

## SMK316B7103KF-T
designator C?  Capacitance: 10nF  (hidden comment: *)
Capacitor, Ceramic (MLCC), 10nF, ±10%, 630V, X7R, ±10%, SMD 1206; Manufacturer: Taiyo Yuden; Manufacturer Part Number: SMK316B7103KF-T; Package Size: 1206; JLCPCB Basic Part: No; JLCPCB Part Number: C651010; Supplier 1: LCSC; Category: Capacitors - MLCC; Supplier Part Number 1: C651010; Tolerance: ±10%; Voltage Rating: 630V; Temperature Coefficient: X7R; RoHS: Yes; ComponentLink1Description: Datasheet; ComponentLink1URL: https://wmsc.lcsc.com/wmsc/upload/file/pdf/v2/lcsc/2304140030_Taiyo-Yuden-SMK316B7103KF-T_C651010.pdf; ComponentLink2Description: JLCPCB Part URL; ComponentLink2URL: https://jlcpcb.com/partdetail/C651010; ComponentLink3Description: LCSC Part URL; ComponentLink3URL: https://lcsc.com/product-detail/Multilayer-Ceramic-Capacitors-MLCC---SMD-SMT_Taiyo-Yuden-Taiyo-Yuden-SMK316B7103KF-T_C651010.html
footprint CAP-1206 (1206 (3216M) Capacitor)
pins: 1, 2

## SMK316B7222KFHT
designator C?  Capacitance: 2.2nF  (hidden comment: *)
Capacitor, Ceramic (MLCC), 2.2nF, ±10%, 630V, X7R, ±10%, SMD 1206; Manufacturer: Taiyo Yuden; Manufacturer Part Number: SMK316B7222KFHT; Package Size: 1206; JLCPCB Basic Part: No; JLCPCB Part Number: C2240335; Supplier 1: LCSC; Category: Capacitors - MLCC; Supplier Part Number 1: C2240335; Tolerance: ±10%; Voltage Rating: 630V; Temperature Coefficient: X7R; RoHS: Yes; ComponentLink1Description: Datasheet; ComponentLink1URL: https://wmsc.lcsc.com/wmsc/upload/file/pdf/v2/lcsc/2309051401_Taiyo-Yuden-SMK316B7222KFHT_C2240335.pdf; ComponentLink2Description: JLCPCB Part URL; ComponentLink2URL: https://jlcpcb.com/partdetail/C2240335; ComponentLink3Description: LCSC Part URL; ComponentLink3URL: https://lcsc.com/product-detail/Multilayer-Ceramic-Capacitors-MLCC---SMD-SMT_Taiyo-Yuden-Taiyo-Yuden-SMK316B7222KFHT_C2240335.html
footprint CAP-1206 (1206 (3216M) Capacitor)
pins: 1, 2

## SMK316B7472KFHT
designator C?  Capacitance: 4.7nF  (hidden comment: *)
Capacitor, Ceramic (MLCC), 4.7nF, ±10%, 630V, X7R, ±10%, SMD 1206; Manufacturer: Taiyo Yuden; Manufacturer Part Number: SMK316B7472KFHT; Package Size: 1206; JLCPCB Basic Part: No; JLCPCB Part Number: C2240155; Supplier 1: LCSC; Category: Capacitors - MLCC; Supplier Part Number 1: C2240155; Tolerance: ±10%; Voltage Rating: 630V; Temperature Coefficient: X7R; RoHS: Yes; ComponentLink1Description: Datasheet; ComponentLink1URL: https://wmsc.lcsc.com/wmsc/upload/file/pdf/v2/lcsc/2309051400_Taiyo-Yuden-SMK316B7472KFHT_C2240155.pdf; ComponentLink2Description: JLCPCB Part URL; ComponentLink2URL: https://jlcpcb.com/partdetail/C2240155; ComponentLink3Description: LCSC Part URL; ComponentLink3URL: https://lcsc.com/product-detail/Multilayer-Ceramic-Capacitors-MLCC---SMD-SMT_Taiyo-Yuden-Taiyo-Yuden-SMK316B7472KFHT_C2240155.html
footprint CAP-1206 (1206 (3216M) Capacitor)
pins: 1, 2

## TCC1206COG1R0C102DT
designator C?  Capacitance: 1pF  (hidden comment: *)
Capacitor, Ceramic (MLCC), 1pF, 1kV, null, SMD 1206; Manufacturer: CCTC; Manufacturer Part Number: TCC1206COG1R0C102DT; Package Size: 1206; JLCPCB Basic Part: No; JLCPCB Part Number: C5449042; Supplier 1: LCSC; Category: Capacitors - MLCC; Supplier Part Number 1: C5449042; Voltage Rating: 1kV; Temperature Coefficient: null; RoHS: Yes; ComponentLink1Description: Datasheet; ComponentLink1URL: https://wmsc.lcsc.com/wmsc/upload/file/pdf/v2/lcsc/2403281714_CCTC-TCC1206COG1R0C102DT_C5449042.pdf; ComponentLink2Description: JLCPCB Part URL; ComponentLink2URL: https://jlcpcb.com/partdetail/C5449042; ComponentLink3Description: LCSC Part URL; ComponentLink3URL: https://lcsc.com/product-detail/Multilayer-Ceramic-Capacitors-MLCC---SMD-SMT_CCTC-CCTC-TCC1206COG1R0C102DT_C5449042.html
footprint CAP-1206 (1206 (3216M) Capacitor)
pins: 1, 2

## TCC1206COG3R0C102DT
designator C?  Capacitance: 3pF  (hidden comment: *)
Capacitor, Ceramic (MLCC), 3pF, 1kV, null, SMD 1206; Manufacturer: CCTC; Manufacturer Part Number: TCC1206COG3R0C102DT; Package Size: 1206; JLCPCB Basic Part: No; JLCPCB Part Number: C5449033; Supplier 1: LCSC; Category: Capacitors - MLCC; Supplier Part Number 1: C5449033; Voltage Rating: 1kV; Temperature Coefficient: null; RoHS: Yes; ComponentLink1Description: Datasheet; ComponentLink1URL: https://wmsc.lcsc.com/wmsc/upload/file/pdf/v2/lcsc/2403281714_CCTC-TCC1206COG3R0C102DT_C5449033.pdf; ComponentLink2Description: JLCPCB Part URL; ComponentLink2URL: https://jlcpcb.com/partdetail/C5449033; ComponentLink3Description: LCSC Part URL; ComponentLink3URL: https://lcsc.com/product-detail/Multilayer-Ceramic-Capacitors-MLCC---SMD-SMT_CCTC-CCTC-TCC1206COG3R0C102DT_C5449033.html
footprint CAP-1206 (1206 (3216M) Capacitor)
pins: 1, 2

## TCC1206COG3R0C500DT
designator C?  Capacitance: 3pF  (hidden comment: *)
Capacitor, Ceramic (MLCC), 3pF, 50V, C0G, SMD 1206; Manufacturer: CCTC; Manufacturer Part Number: TCC1206COG3R0C500DT; Package Size: 1206; JLCPCB Basic Part: No; JLCPCB Part Number: C282794; Supplier 1: LCSC; Category: Capacitors - MLCC; Supplier Part Number 1: C282794; Voltage Rating: 50V; Temperature Coefficient: C0G; RoHS: Yes; ComponentLink1Description: Datasheet; ComponentLink1URL: https://wmsc.lcsc.com/wmsc/upload/file/pdf/v2/lcsc/2304140030_CCTC-TCC1206COG3R0C500DT_C282794.pdf; ComponentLink2Description: JLCPCB Part URL; ComponentLink2URL: https://jlcpcb.com/partdetail/C282794; ComponentLink3Description: LCSC Part URL; ComponentLink3URL: https://lcsc.com/product-detail/Multilayer-Ceramic-Capacitors-MLCC---SMD-SMT_CCTC-CCTC-TCC1206COG3R0C500DT_C282794.html
footprint CAP-1206 (1206 (3216M) Capacitor)
pins: 1, 2

## TCC1206COG5R0C102DT
designator C?  Capacitance: 5pF  (hidden comment: *)
Capacitor, Ceramic (MLCC), 5pF, 1kV, null, SMD 1206; Manufacturer: CCTC; Manufacturer Part Number: TCC1206COG5R0C102DT; Package Size: 1206; JLCPCB Basic Part: No; JLCPCB Part Number: C7393975; Supplier 1: LCSC; Category: Capacitors - MLCC; Supplier Part Number 1: C7393975; Voltage Rating: 1kV; Temperature Coefficient: null; RoHS: Yes; ComponentLink1Description: Datasheet; ComponentLink1URL: https://wmsc.lcsc.com/wmsc/upload/file/pdf/v2/lcsc/2306211528_CCTC-TCC1206COG5R0C102DT_C7393975.pdf; ComponentLink2Description: JLCPCB Part URL; ComponentLink2URL: https://jlcpcb.com/partdetail/C7393975; ComponentLink3Description: LCSC Part URL; ComponentLink3URL: https://lcsc.com/product-detail/Multilayer-Ceramic-Capacitors-MLCC---SMD-SMT_CCTC-CCTC-TCC1206COG5R0C102DT_C7393975.html
footprint CAP-1206 (1206 (3216M) Capacitor)
pins: 1, 2

## TCC1206COG5R0D500DT
designator C?  Capacitance: 5pF  (hidden comment: *)
Capacitor, Ceramic (MLCC), 5pF, 50V, C0G, SMD 1206; Manufacturer: CCTC; Manufacturer Part Number: TCC1206COG5R0D500DT; Package Size: 1206; JLCPCB Basic Part: No; JLCPCB Part Number: C282801; Supplier 1: LCSC; Category: Capacitors - MLCC; Supplier Part Number 1: C282801; Voltage Rating: 50V; Temperature Coefficient: C0G; RoHS: Yes; ComponentLink1Description: Datasheet; ComponentLink1URL: https://wmsc.lcsc.com/wmsc/upload/file/pdf/v2/lcsc/2304140030_CCTC-TCC1206COG5R0D500DT_C282801.pdf; ComponentLink2Description: JLCPCB Part URL; ComponentLink2URL: https://jlcpcb.com/partdetail/C282801; ComponentLink3Description: LCSC Part URL; ComponentLink3URL: https://lcsc.com/product-detail/Multilayer-Ceramic-Capacitors-MLCC---SMD-SMT_CCTC-CCTC-TCC1206COG5R0D500DT_C282801.html
footprint CAP-1206 (1206 (3216M) Capacitor)
pins: 1, 2

## TCC1206COG6R0D500DT
designator C?  Capacitance: 6pF  (hidden comment: *)
Capacitor, Ceramic (MLCC), 6pF, 50V, C0G, SMD 1206; Manufacturer: CCTC; Manufacturer Part Number: TCC1206COG6R0D500DT; Package Size: 1206; JLCPCB Basic Part: No; JLCPCB Part Number: C282804; Supplier 1: LCSC; Category: Capacitors - MLCC; Supplier Part Number 1: C282804; Voltage Rating: 50V; Temperature Coefficient: C0G; RoHS: Yes; ComponentLink1Description: Datasheet; ComponentLink1URL: https://wmsc.lcsc.com/wmsc/upload/file/pdf/v2/lcsc/2304140030_CCTC-TCC1206COG6R0D500DT_C282804.pdf; ComponentLink2Description: JLCPCB Part URL; ComponentLink2URL: https://jlcpcb.com/partdetail/C282804; ComponentLink3Description: LCSC Part URL; ComponentLink3URL: https://lcsc.com/product-detail/Multilayer-Ceramic-Capacitors-MLCC---SMD-SMT_CCTC-CCTC-TCC1206COG6R0D500DT_C282804.html
footprint CAP-1206 (1206 (3216M) Capacitor)
pins: 1, 2

## TCC1206COG100J102DT
designator C?  Capacitance: 10pF  (hidden comment: *)
Capacitor, Ceramic (MLCC), 10pF, ±5%, 1kV, C0G, ±5%, SMD 1206; Manufacturer: CCTC; Manufacturer Part Number: TCC1206COG100J102DT; Package Size: 1206; JLCPCB Basic Part: No; JLCPCB Part Number: C377014; Supplier 1: LCSC; Category: Capacitors - MLCC; Supplier Part Number 1: C377014; Tolerance: ±5%; Voltage Rating: 1kV; Temperature Coefficient: C0G; RoHS: Yes; ComponentLink1Description: Datasheet; ComponentLink1URL: https://wmsc.lcsc.com/wmsc/upload/file/pdf/v2/lcsc/2304140030_CCTC-TCC1206COG100J102DT_C377014.pdf; ComponentLink2Description: JLCPCB Part URL; ComponentLink2URL: https://jlcpcb.com/partdetail/C377014; ComponentLink3Description: LCSC Part URL; ComponentLink3URL: https://lcsc.com/product-detail/Multilayer-Ceramic-Capacitors-MLCC---SMD-SMT_CCTC-CCTC-TCC1206COG100J102DT_C377014.html
footprint CAP-1206 (1206 (3216M) Capacitor)
pins: 1, 2
